# Altium footprint library myPcbLib.PcbLib: 987 footprints (part 60 of 62)
Each footprint in its own frame and in the unit in brackets; x right, y up, seen from the top. Pads: shape width x height; smd on the part's side, far side on the other; paste and mask are expansions set on the pad; w line width, h text height; cw(c..) or ccw(c..) is an arc to the next point about the centre after c.
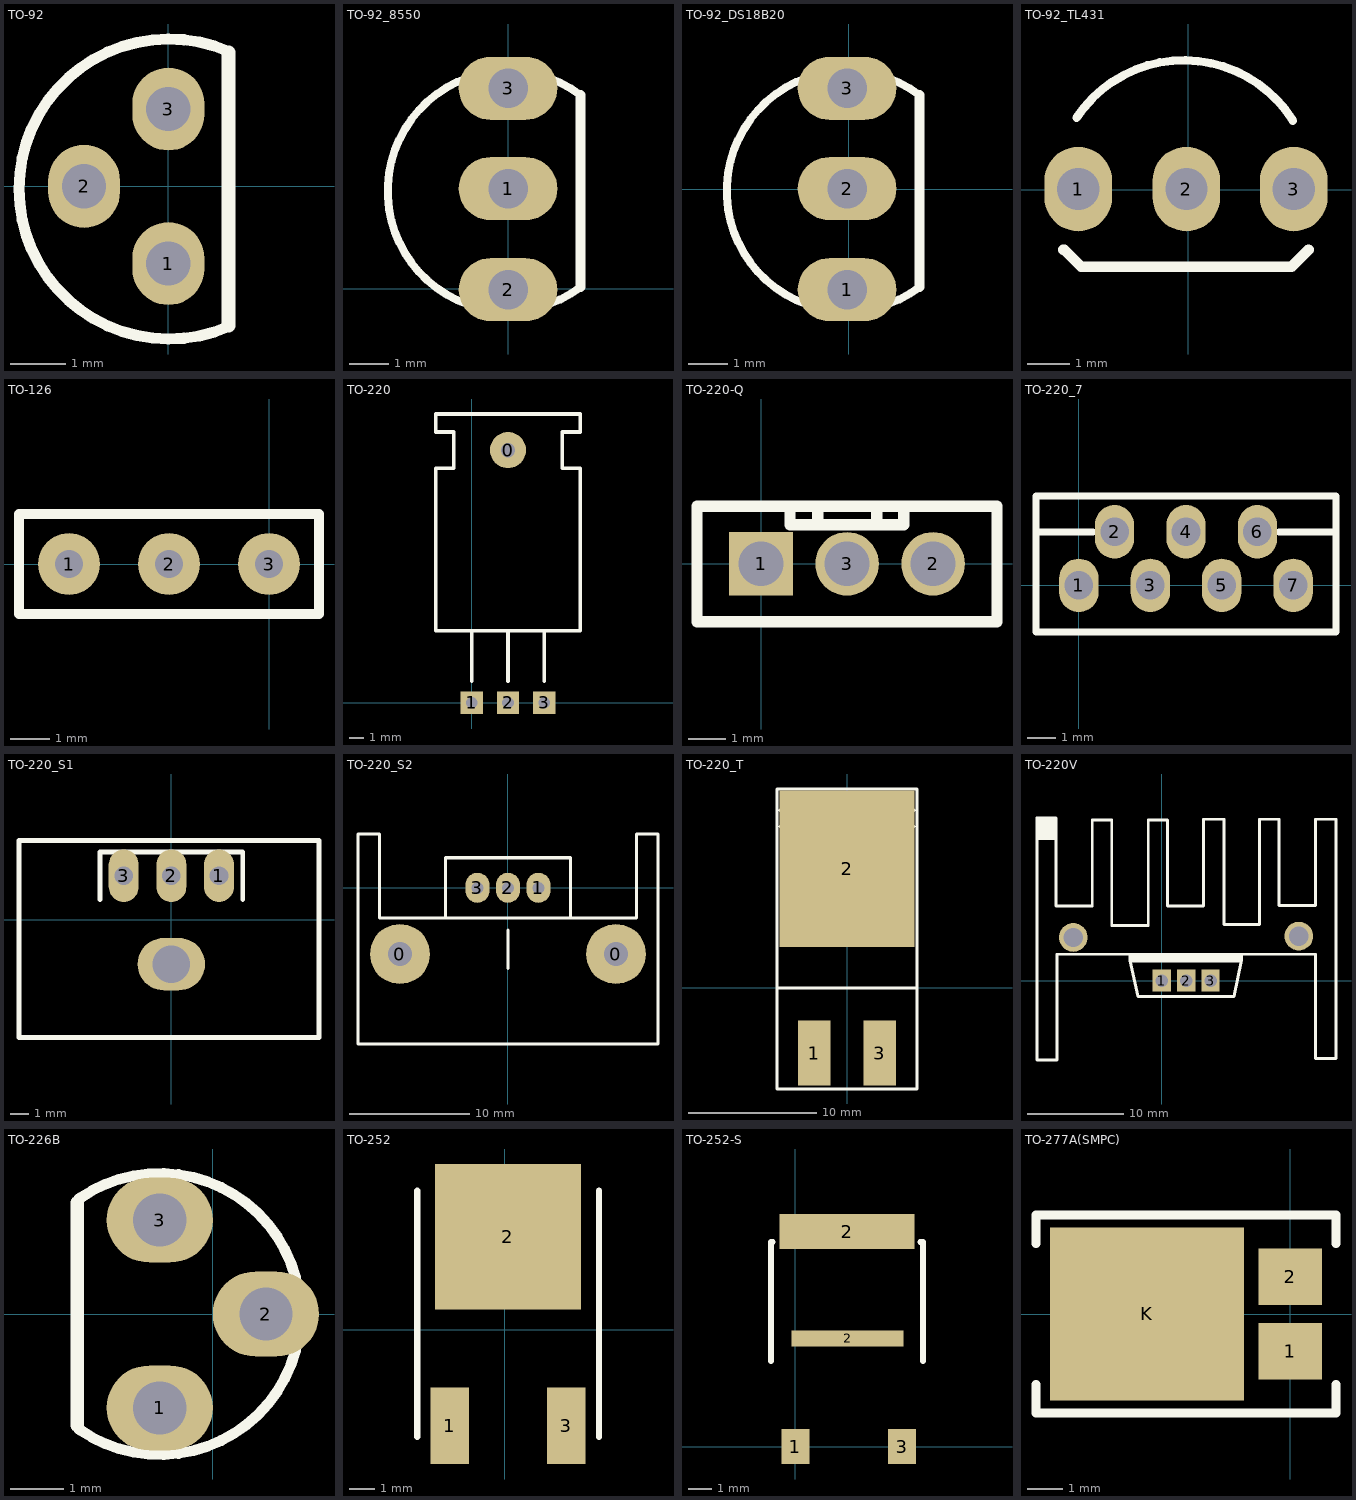
[diagram p59: the footprints below, top view; thin cyan lines are the x and y axes]

## TO-92 [mm]
pads (3):
  oval 1.3x1.5 hole 0.8: 1(0,-1.397) 2(-1.524,0) 3(0,1.397)
Top Overlay:
  lines w0.2: 1.099,-2.534 cw(c0.012,-0.049) 1.099,2.436
  lines w0.254: 1.09,-2.514 1.09,2.416

## TO-92_8550 [mm]
pads (3):
  oval 2.5x1.6 hole 1: 1(0,2.54) 2(0,-0.02) 3(0,5.08)
Top Overlay:
  lines w0.2: 1.839,0.049 cw(c-0.001,2.478) 1.839,4.907
  lines w0.254: 1.839,0.049 1.839,4.907

## TO-92_DS18B20 [mm]
pads (3):
  oval 2.5x1.6 hole 1: 1(-0.038,-2.547) 2(-0.038,0.013) 3(-0.038,2.553)
Top Overlay:
  lines w0.2: 1.801,-2.478 cw(c-0.039,-0.049) 1.801,2.38
  lines w0.254: 1.801,-2.478 1.801,2.38

## TO-92_TL431 [mm]
height 2.7
pads (3):
  oval 1.6x2 hole 1: 1(-2.598,0.013) 2(-0.038,0.013) 3(2.502,0.013)
Top Overlay:
  lines w0.2: -2.639,1.7 cw(c-0.1,0.014) 2.482,1.633
  lines w0.254: -2.951,-1.425 -2.931,-1.425 -2.529,-1.826 2.329,-1.826 2.448,-1.826 2.849,-1.425

## TO-126 [mil]
pads (3):
  round 62 hole 28: 1(-200,0) 2(-100,0) 3(0,0)
Top Overlay:
  lines w10: -250,-50 50,-50 50,50 -250,50 -250,-50

## TO-220 [mil]
pads (4):
  round 100 hole 40: 0(100,700)
  rect 62x62 hole 32: 1(0,0) 2(100,0) 3(200,0)
Top Overlay:
  lines w10: 0,60 0,200 ; 100,60 100,200 ; 200,60 200,200 ; -100,200 -100,650 -50,650 -50,750 -100,750 -100,800 300,800 300,750 250,750 250,650 300,650 300,200 -100,200

## TO-220-Q [mm]
pads (3):
  rect 1.7x1.7 hole 1.2: 1(0,0)
  round 1.7 hole 1.2: 2(4.6,0) 3(2.3,0)
Top Overlay:
  lines w0.305: 0.775,1.492 0.775,1.048 3.812,1.048 3.812,1.45 ; 1.516,1.164 1.516,1.513 ; 3.092,1.164 3.092,1.535 ; 6.31,1.492 6.31,-1.545 -1.712,-1.545 -1.712,1.535 6.31,1.535

## TO-220_7 [mil]
pads (7):
  oval 55x75 hole 40: 1(0,0) 2(50,75) 3(100,0) 4(150,75) 5(200,0) 6(250,75) 7(300,0)
Top Overlay:
  lines w10: -60,75 20,75 ; 280,75 360,75 ; -60,-65 -60,125 360,125 360,-65 -60,-65

## TO-220_S1 [mm]
pads (4):
  oval 1.6x2.8 hole 1: 1(2.54,2.358) 2(0,2.358) 3(-2.54,2.358)
  oval 3.6x2.8 hole 2: ""(0,-2.358)
Top Overlay:
  lines w0.254: -3.81,1.088 -3.81,3.628 3.81,3.628 3.81,1.088 ; -8.127,-6.278 -8.127,4.242 7.873,4.242 7.873,-6.278 -8.127,-6.278

## TO-220_S2 [mm]
pads (5):
  round 5 hole 2: 0(-8.99,-5.52) 0(9.01,-5.52)
  oval 2x2.5 hole 1: 1(2.54,0) 2(0,0) 3(-2.54,0)
Top Overlay:
  lines w0.254: 0.01,-6.72 0.01,-3.52 ; 5.2,2.5 -5.2,2.5 -5.2,-2.5 5.229,-2.51 5.229,2.471 ; -12.49,-13.02 12.51,-13.02 12.51,0.98 12.51,4.48 10.71,4.48 10.71,-2.52 6.61,-2.52 -10.69,-2.52 -10.69,-0.62 -10.69,4.48 -12.49,4.48 -12.49,-1.12 -12.49,-13.02

## TO-220_T [mil]
pads (3):
  rect 100x200 smd: 1(-100,-200) 3(100,-200)
  rect 415x480 smd: 2(0,365)
Top Overlay:
  lines w10: -205,495 ccw(c-205,520) -205,545 ; 205,495 cw(c205,520) 205,545 ; 215,15 215,-310 -215,-310 -215,0 ; -215,0 -215,610 215,610 215,0 -215,0

## TO-220V [mm]
pads (5):
  rect 1.9x2.3 hole 1.3: 1(0,0) 2(2.54,0) 3(5.08,0)
  round 3 hole 2: " "(-9.222,4.508) " "(14.283,4.635)
Top Overlay:
  region: -13.032,16.806 -13.032,14.668 -11.043,14.668 -11.043,16.806
  region: -3.253,2.836 -3.253,1.916 8.251,1.916 8.251,2.836
  lines w0.305: -13.03,16.954 -11.019,16.954 ; -13.022,16.849 -13.022,-8.276 -10.926,-8.276 -10.926,2.752 16.019,2.752 16.019,-8.128 18.157,-8.128 18.157,16.817 16.04,16.817 16.04,7.821 12.225,7.821 12.225,16.817 10.198,16.817 10.198,5.842 6.473,5.842 6.473,16.817 4.346,16.817 4.346,7.789 0.61,7.789 0.61,16.753 -1.412,16.753 -1.412,5.768 -5.211,5.768 -5.211,16.732 -7.243,16.732 -7.243,7.768 -11,7.768 -11,16.87 ; -3.327,2.117 -2.481,-1.662 7.51,-1.662 8.314,2.127 ; -3.304,2.091 -3.304,2.716 ; 8.338,2.102 8.338,2.705

## TO-226B [mm]
height 10
pads (3):
  oval 2x1.6 hole 1: 1(-1,-1.77) 2(1,0) 3(-1,1.77)
Top Overlay:
  lines w0.2: -2.52,-2.171 ccw(c-1,0) -2.52,2.171
  lines w0.254: -2.55,-2.1 -2.55,2.1

## TO-252 [mm]
height 6
pads (3):
  rect 1.5x3 smd: 1(-2.166,-3.749) 3(2.404,-3.749)
  rect 5.7x5.7 smd: 2(0.119,3.651)
Top Overlay:
  lines w0.254: -3.429,-4.191 -3.429,5.461 ; 3.683,-4.191 3.683,5.461

## TO-252-S [mm]
pads (4):
  rect 1.2x1.5 smd: 1(0,0) 3(4.572,0)
  rect 5.8x1.5 smd: 2(2.212,9.212)
  rect 4.8x0.7 smd: 2(2.237,4.631)
Top Overlay:
  lines w0.25: -1.048,3.662 -1.048,8.774 -0.974,8.774 ; 5.355,8.774 5.472,8.774 5.472,3.662

## TO-277A(SMPC) [mm]
pads (3):
  rect 1.8x1.6 smd: 1(0,-1.05) 2(0,1.05)
  rect 5.5x4.9 smd: K(-4.05,0)
Top Overlay:
  lines w0.254: -7.2,-2 -7.2,-2.8 1.3,-2.8 1.3,-2 ; -7.2,2 -7.2,2.8 1.3,2.8 1.3,2
3D body "TO-277A.STEP": height 1.2, standoff 0, extent -6.275,-2.375 0.375,2.375